# Altium footprint library Molex FFC - FPC Connectors (SMT).PcbLib: 638 footprints (part 15 of 40)
Each footprint in its own frame and in the unit in brackets; x right, y up, seen from the top. Pads: shape width x height; smd on the part's side, far side on the other; paste and mask are expansions set on the pad; w line width, h text height; cw(c..) or ccw(c..) is an arc to the next point about the centre after c.
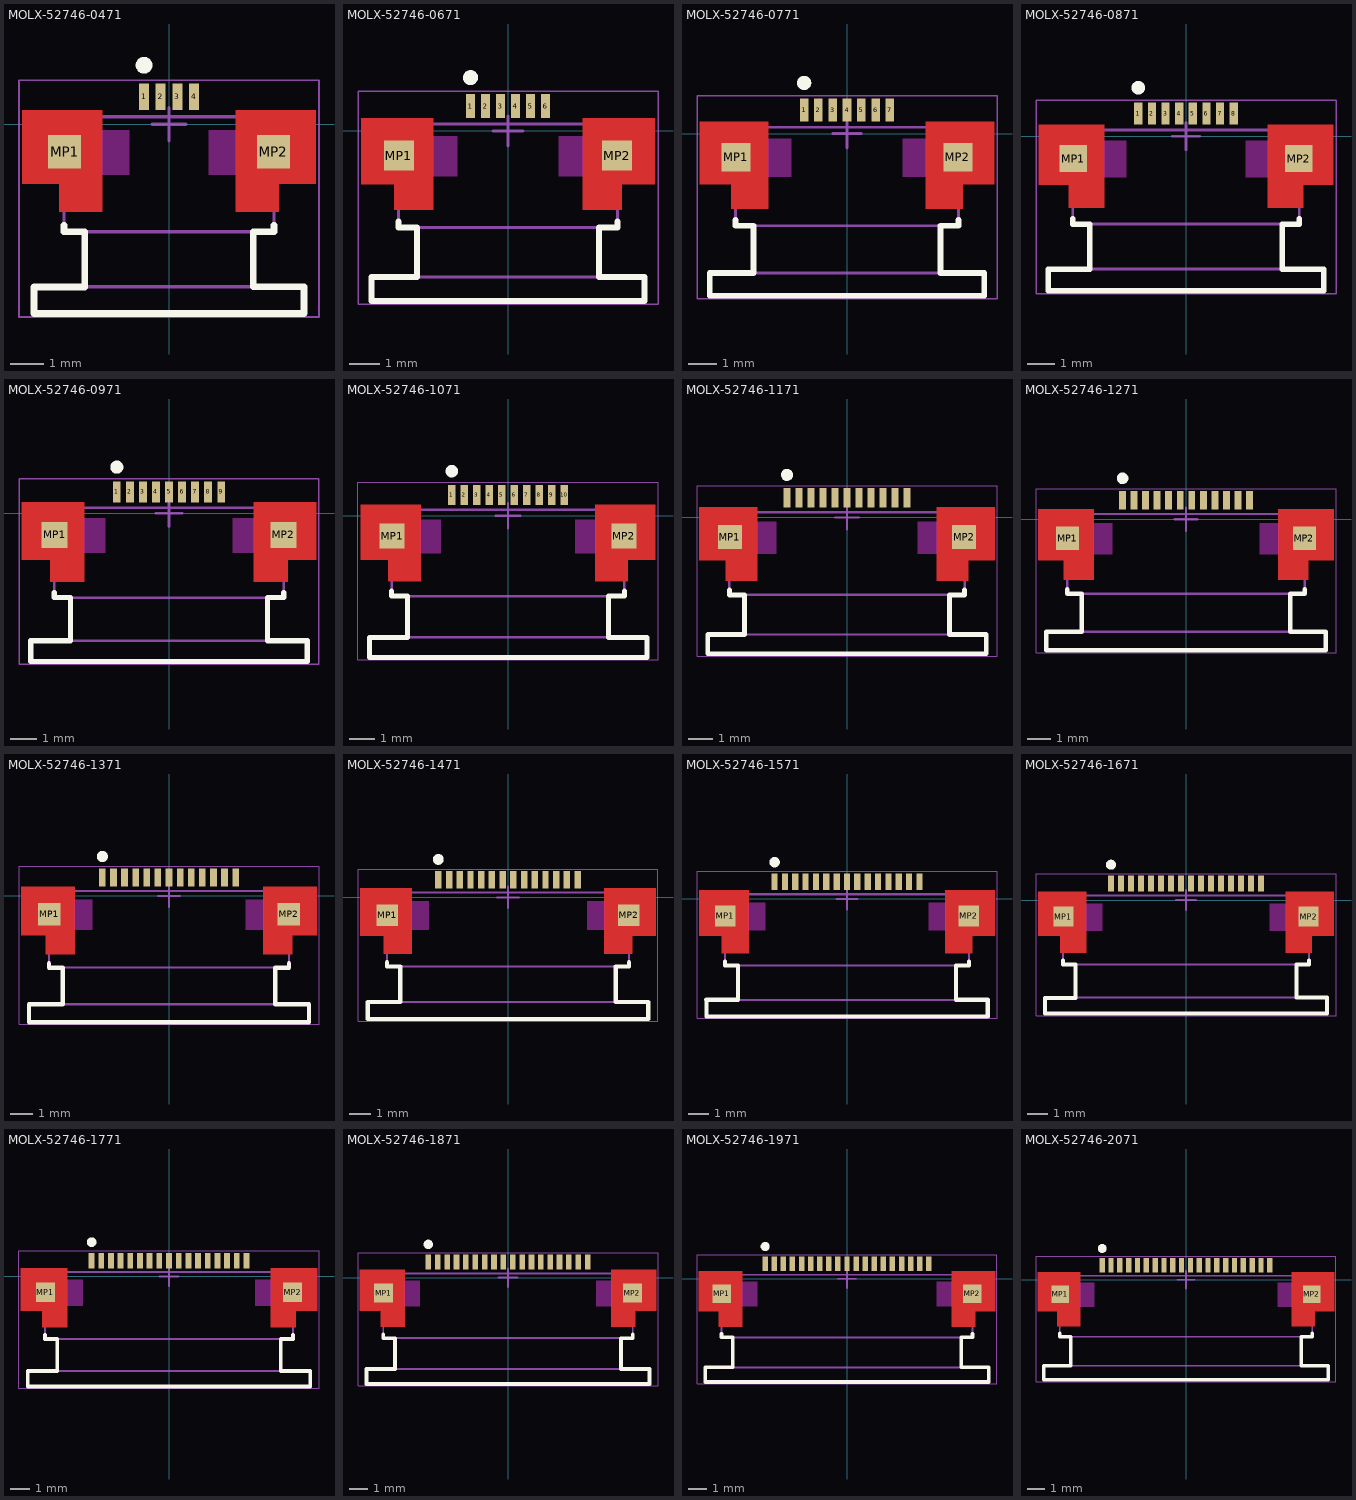
[diagram p14: the footprints below, top view; thin cyan lines are the x and y axes]

## MOLX-52746-0471 [mm] "FPC Connector, 4-Leads, Right Angle, Pitch 0.5 mm, Mated Height 2.0 mm, SMT"
height 2.012
pads (6):
  rect 0.3x0.8 smd: 1(-0.75,0.824) 2(-0.25,0.824) 3(0.25,0.824) 4(0.75,0.824)
  rect 1x1 smd: MP1(-3.134,-0.824) MP2(3.135,-0.824)
Top Layer:
  region: -4.4,0.424 -2,0.424 -2,-2.626 -3.3,-2.626 -3.3,-1.777 -3.3,-1.776 -4.4,-1.776
  region: 2,0.424 4.4,0.424 4.4,-1.776 4.4,-1.777 3.3,-1.777 3.3,-2.626 2,-2.626
Top Overlay:
  circle w0.25: c-0.75,1.774 r0.125
  lines w0.2: -4.05,-5.676 -4.05,-4.877 -2.525,-4.877 -2.525,-3.239 ; -4.049,-5.676 4.05,-5.676 4.05,-4.876 2.525,-4.876 2.525,-3.226 3.15,-3.226 3.15,-3.026 ; -3.15,-3.026 -3.15,-3.226 -2.525,-3.226
Keep-Out Layer:
  region: -2,-0.176 -1.2,-0.176 -1.2,-1.516 -2,-1.516
  region: 2,-0.176 1.2,-0.176 1.2,-1.516 2,-1.516
Mechanical 13:
  lines w0.1: -2.525,-4.876 -2.525,-3.226 ; 2.525,-4.876 2.525,-3.226 ; -4.05,-5.676 -4.05,-4.877 -2.4,-4.876 2.4,-4.876 4.05,-4.876 4.05,-5.677 -4.05,-5.677 ; -3.15,-3.226 -3.15,0.224 3.15,0.224 3.15,-3.226 2.4,-3.226 -2.4,-3.226 -3.15,-3.226
Mechanical 15:
  lines w0.05: -4.5,-5.777 -4.5,1.324 4.5,1.324 4.5,-5.777 -4.5,-5.777
  lines w0.1: -0.5,0 0.5,0 ; 0,-0.5 0,0.5
3D body: height 0.25, standoff 0, extent -4.05,-5.676 4.05,0.924

## MOLX-52746-0671 [mm] "FPC Connector, 6-Leads, Right Angle, Pitch 0.5 mm, Mated Height 2.0 mm, SMT"
height 2.012
pads (8):
  rect 0.3x0.8 smd: 1(-1.25,0.824) 2(-0.75,0.824) 3(-0.25,0.824) 4(0.25,0.824) 5(0.75,0.824) 6(1.25,0.824)
  rect 1x1 smd: MP1(-3.634,-0.824) MP2(3.635,-0.824)
Top Layer:
  region: -4.9,0.424 -2.5,0.424 -2.5,-2.626 -3.8,-2.626 -3.8,-1.777 -3.8,-1.776 -4.9,-1.776
  region: 2.5,0.424 4.9,0.424 4.9,-1.776 4.9,-1.777 3.8,-1.777 3.8,-2.626 2.5,-2.626
Top Overlay:
  circle w0.25: c-1.25,1.774 r0.125
  lines w0.2: -3.65,-3.026 -3.65,-3.226 -3.025,-3.226 ; -3.025,-3.239 -3.025,-4.876 -4.55,-4.877 -4.55,-5.676 4.55,-5.676 4.55,-4.876 3.025,-4.876 3.025,-3.226 3.65,-3.226 3.65,-3.026
Keep-Out Layer:
  region: -2.5,-0.176 -1.7,-0.176 -1.7,-1.516 -2.5,-1.516
  region: 2.5,-0.176 1.7,-0.176 1.7,-1.516 2.5,-1.516
Mechanical 13:
  lines w0.1: -4.55,-4.876 -2.9,-4.876 2.9,-4.876 4.55,-4.876 4.55,-5.677 -4.55,-5.677 -4.55,-4.877 ; -3.025,-4.876 -3.025,-3.226 ; 3.025,-4.876 3.025,-3.226 ; -3.65,-3.226 -3.65,0.224 3.65,0.224 3.65,-3.226 2.9,-3.226 -2.9,-3.226 -3.65,-3.226
Mechanical 15:
  lines w0.05: -5,-5.777 5,-5.777 5,1.324 -5,1.324 -5,-5.777
  lines w0.1: -0.5,0 0.5,0 ; 0,-0.5 0,0.5
3D body: height 0.25, standoff 0, extent -4.55,-5.676 4.55,0.924

## MOLX-52746-0771 [mm] "FPC Connector, 7-Leads, Right Angle, Pitch 0.5 mm, Mated Height 2.0 mm, SMT"
height 2.012
pads (9):
  rect 0.3x0.8 smd: 1(-1.5,0.824) 2(-1,0.824) 3(-0.5,0.824) 4(0,0.824) 5(0.5,0.824) 6(1,0.824) 7(1.5,0.824)
  rect 1x1 smd: MP1(-3.885,-0.824) MP2(3.885,-0.824)
Top Layer:
  region: 2.75,0.424 5.15,0.424 5.15,-1.776 5.15,-1.777 4.05,-1.777 4.05,-2.626 2.75,-2.626
  region: -5.15,0.424 -2.75,0.424 -2.75,-2.626 -4.05,-2.626 -4.05,-1.777 -4.05,-1.776 -5.15,-1.776
Top Overlay:
  circle w0.25: c-1.5,1.774 r0.125
  lines w0.2: -3.9,-3.026 -3.9,-3.226 -3.275,-3.226 ; -3.275,-3.239 -3.275,-4.876 -4.8,-4.877 -4.8,-5.676 4.8,-5.676 4.8,-4.876 3.275,-4.876 3.275,-3.226 3.9,-3.226 3.9,-3.026
Keep-Out Layer:
  region: 2.75,-0.176 1.95,-0.176 1.95,-1.516 2.75,-1.516
  region: -2.75,-0.176 -1.95,-0.176 -1.95,-1.516 -2.75,-1.516
Mechanical 13:
  lines w0.1: -4.8,-4.876 -3.15,-4.876 3.15,-4.876 4.8,-4.876 4.8,-5.677 -4.8,-5.677 -4.8,-4.877 ; -3.275,-4.876 -3.275,-3.226 ; 3.275,-4.876 3.275,-3.226 ; -3.9,-3.226 -3.15,-3.226 3.15,-3.226 3.9,-3.226 3.9,0.224 -3.9,0.224 -3.9,-3.226
Mechanical 15:
  lines w0.05: -5.25,-5.776 -5.25,1.324 5.25,1.324 5.25,-5.776 -5.25,-5.776
  lines w0.1: -0.5,0 0.5,0 ; 0,-0.5 0,0.5
3D body: height 0.25, standoff 0, extent -4.8,-5.676 4.8,0.924

## MOLX-52746-0871 [mm] "FPC Connector, 8-Leads, Right Angle, Pitch 0.5 mm, Mated Height 2.0 mm, SMT"
height 2.012
pads (10):
  rect 0.3x0.8 smd: 1(-1.75,0.824) 2(-1.25,0.824) 3(-0.75,0.824) 4(-0.25,0.824) 5(0.25,0.824) 6(0.75,0.824) 7(1.25,0.824) 8(1.75,0.824)
  rect 1x1 smd: MP1(-4.134,-0.824) MP2(4.135,-0.824)
Top Layer:
  region: -5.4,0.424 -3,0.424 -3,-2.626 -4.3,-2.626 -4.3,-1.777 -4.3,-1.776 -5.4,-1.776
  region: 3,0.424 5.4,0.424 5.4,-1.776 5.4,-1.777 4.3,-1.777 4.3,-2.626 3,-2.626
Top Overlay:
  circle w0.25: c-1.75,1.774 r0.125
  lines w0.2: -4.15,-3.026 -4.15,-3.226 -3.525,-3.226 ; -3.525,-3.239 -3.525,-4.876 -5.05,-4.877 -5.05,-5.676 5.05,-5.676 5.05,-4.876 3.525,-4.876 3.525,-3.226 4.15,-3.226 4.15,-3.026
Keep-Out Layer:
  region: -3,-0.176 -2.2,-0.176 -2.2,-1.516 -3,-1.516
  region: 3,-0.176 2.2,-0.176 2.2,-1.516 3,-1.516
Mechanical 13:
  lines w0.1: -3.525,-4.876 -3.525,-3.226 ; 3.525,-4.876 3.525,-3.226 ; -5.05,-5.676 -5.05,-4.877 -3.4,-4.876 3.4,-4.876 5.05,-4.876 5.05,-5.677 -5.05,-5.677 ; -4.15,-3.226 -4.15,0.224 4.15,0.224 4.15,-3.226 3.4,-3.226 -3.4,-3.226 -4.15,-3.226
Mechanical 15:
  lines w0.05: -5.5,-5.777 5.5,-5.777 5.5,1.324 -5.5,1.324 -5.5,-5.777
  lines w0.1: -0.5,0 0.5,0 ; 0,-0.5 0,0.5
3D body: height 0.25, standoff 0, extent -5.05,-5.676 5.05,0.924

## MOLX-52746-0971 [mm] "FPC Connector, 9-Leads, Right Angle, Pitch 0.5 mm, Mated Height 2.0 mm, SMT"
height 2.012
pads (11):
  rect 0.3x0.8 smd: 1(-2,0.824) 2(-1.5,0.824) 3(-1,0.824) 4(-0.5,0.824) 5(0,0.824) 6(0.5,0.824) 7(1,0.824) 8(1.5,0.824) 9(2,0.824)
  rect 1x1 smd: MP1(-4.384,-0.824) MP2(4.385,-0.824)
Top Layer:
  region: -5.65,0.424 -3.25,0.424 -3.25,-2.626 -4.55,-2.626 -4.55,-1.777 -4.55,-1.776 -5.65,-1.776
  region: 3.25,0.424 5.65,0.424 5.65,-1.776 5.65,-1.777 4.55,-1.777 4.55,-2.626 3.25,-2.626
Top Overlay:
  circle w0.25: c-2,1.774 r0.125
  lines w0.2: -4.4,-3.026 -4.4,-3.226 -3.775,-3.226 ; -3.775,-3.239 -3.775,-4.876 -5.3,-4.877 -5.3,-5.676 5.3,-5.676 5.3,-4.876 3.775,-4.876 3.775,-3.226 4.4,-3.226 4.4,-3.026
Keep-Out Layer:
  region: -3.25,-0.176 -2.45,-0.176 -2.45,-1.516 -3.25,-1.516
  region: 3.25,-0.176 2.45,-0.176 2.45,-1.516 3.25,-1.516
Mechanical 13:
  lines w0.1: -3.775,-4.876 -3.775,-3.226 ; 3.775,-4.876 3.775,-3.226 ; -5.3,-5.676 -5.3,-4.877 -3.65,-4.876 3.65,-4.876 5.3,-4.876 5.3,-5.677 -5.3,-5.677 ; -4.4,-3.226 -4.4,0.224 4.4,0.224 4.4,-3.226 3.65,-3.226 -3.65,-3.226 -4.4,-3.226
Mechanical 15:
  lines w0.05: -5.75,-5.776 5.75,-5.776 5.75,1.324 -5.75,1.324 -5.75,-5.776
  lines w0.1: -0.5,0 0.5,0 ; 0,-0.5 0,0.5
3D body: height 0.25, standoff 0, extent -5.3,-5.676 5.3,0.924

## MOLX-52746-1071 [mm] "FPC Connector, 10-Leads, Right Angle, Pitch 0.5 mm, Mated Height 2.0 mm, SMT"
height 2.012
pads (12):
  rect 0.3x0.8 smd: 1(-2.25,0.824) 2(-1.75,0.824) 3(-1.25,0.824) 4(-0.75,0.824) 5(-0.25,0.824) 6(0.25,0.824) 7(0.75,0.824) 8(1.25,0.824) 9(1.75,0.824) 10(2.25,0.824)
  rect 1x1 smd: MP1(-4.634,-0.824) MP2(4.635,-0.824)
Top Layer:
  region: -5.9,0.424 -3.5,0.424 -3.5,-2.626 -4.8,-2.626 -4.8,-1.777 -4.8,-1.776 -5.9,-1.776
  region: 3.5,0.424 5.9,0.424 5.9,-1.776 5.9,-1.777 4.8,-1.777 4.8,-2.626 3.5,-2.626
Top Overlay:
  circle w0.25: c-2.25,1.774 r0.125
  lines w0.2: -4.65,-3.026 -4.65,-3.226 -4.025,-3.226 ; -4.025,-3.239 -4.025,-4.876 -5.55,-4.877 -5.55,-5.676 5.55,-5.676 5.55,-4.876 4.025,-4.876 4.025,-3.226 4.65,-3.226 4.65,-3.026
Keep-Out Layer:
  region: -3.5,-0.176 -2.7,-0.176 -2.7,-1.516 -3.5,-1.516
  region: 3.5,-0.176 2.7,-0.176 2.7,-1.516 3.5,-1.516
Mechanical 13:
  lines w0.1: -4.025,-4.876 -4.025,-3.226 ; 4.025,-4.876 4.025,-3.226 ; -5.55,-5.676 -5.55,-4.877 -3.9,-4.876 3.9,-4.876 5.55,-4.876 5.55,-5.677 -5.55,-5.677 ; -4.65,-3.226 -4.65,0.224 4.65,0.224 4.65,-3.226 3.9,-3.226 -3.9,-3.226 -4.65,-3.226
Mechanical 15:
  lines w0.05: -6,-5.777 6,-5.777 6,1.324 -6,1.324 -6,-5.777
  lines w0.1: -0.5,0 0.5,0 ; 0,-0.5 0,0.5
3D body: height 0.25, standoff 0, extent -5.55,-5.676 5.55,0.924

## MOLX-52746-1171 [mm] "FPC Connector, 11-Leads, Right Angle, Pitch 0.5 mm, Mated Height 2.0 mm, SMT"
height 2.012
pads (13):
  rect 0.3x0.8 smd: 1(-2.5,0.824) 2(-2,0.824) 3(-1.5,0.824) 4(-1,0.824) 5(-0.5,0.824) 6(0,0.824) 7(0.5,0.824) 8(1,0.824) 9(1.5,0.824) 10(2,0.824) 11(2.5,0.824)
  rect 1x1 smd: MP1(-4.884,-0.824) MP2(4.884,-0.824)
Top Layer:
  region: -6.15,0.424 -3.75,0.424 -3.75,-2.626 -5.05,-2.626 -5.05,-1.777 -5.05,-1.776 -6.15,-1.776
  region: 3.75,0.424 6.15,0.424 6.15,-1.776 6.15,-1.777 5.05,-1.777 5.05,-2.626 3.75,-2.626
Top Overlay:
  circle w0.25: c-2.5,1.774 r0.125
  lines w0.2: -4.9,-3.026 -4.9,-3.226 -4.275,-3.226 ; -4.275,-3.239 -4.275,-4.876 -5.8,-4.877 -5.8,-5.676 5.8,-5.676 5.8,-4.876 4.275,-4.876 4.275,-3.226 4.9,-3.226 4.9,-3.026
Keep-Out Layer:
  region: -3.75,-0.176 -2.95,-0.176 -2.95,-1.516 -3.75,-1.516
  region: 3.75,-0.176 2.95,-0.176 2.95,-1.516 3.75,-1.516
Mechanical 13:
  lines w0.1: -4.275,-4.876 -4.275,-3.226 ; 4.275,-4.876 4.275,-3.226 ; -5.8,-5.676 -5.8,-4.877 -4.15,-4.876 4.15,-4.876 5.8,-4.876 5.8,-5.677 -5.8,-5.677 ; -4.9,-3.226 -4.9,0.224 4.9,0.224 4.9,-3.226 4.15,-3.226 -4.15,-3.226 -4.9,-3.226
Mechanical 15:
  lines w0.05: -6.25,-5.776 6.25,-5.776 6.25,1.324 -6.25,1.324 -6.25,-5.776
  lines w0.1: -0.5,0 0.5,0 ; 0,-0.5 0,0.5
3D body: height 0.25, standoff 0, extent -5.8,-5.676 5.8,0.924

## MOLX-52746-1271 [mm] "FPC Connector, 12-Leads, Right Angle, Pitch 0.5 mm, Mated Height 2.0 mm, SMT"
height 2.012
pads (14):
  rect 0.3x0.8 smd: 1(-2.75,0.824) 2(-2.25,0.824) 3(-1.75,0.824) 4(-1.25,0.824) 5(-0.75,0.824) 6(-0.25,0.824) 7(0.25,0.824) 8(0.75,0.824) 9(1.25,0.824) 10(1.75,0.824) 11(2.25,0.824) 12(2.75,0.824)
  rect 1x1 smd: MP1(-5.134,-0.824) MP2(5.135,-0.824)
Top Layer:
  region: 4,0.424 6.4,0.424 6.4,-1.776 6.4,-1.777 5.3,-1.777 5.3,-2.626 4,-2.626
  region: -6.4,0.424 -4,0.424 -4,-2.626 -5.3,-2.626 -5.3,-1.777 -5.3,-1.776 -6.4,-1.776
Top Overlay:
  circle w0.25: c-2.75,1.774 r0.125
  lines w0.2: -6.05,-4.877 -4.525,-4.877 -4.525,-3.239 ; -6.05,-4.877 -6.05,-5.676 6.05,-5.676 6.05,-4.876 4.525,-4.876 4.525,-3.226 5.15,-3.226 5.15,-3.026 ; -5.15,-3.026 -5.15,-3.226 -4.525,-3.226
Keep-Out Layer:
  region: 4,-0.176 3.2,-0.176 3.2,-1.516 4,-1.516
  region: -4,-0.176 -3.2,-0.176 -3.2,-1.516 -4,-1.516
Mechanical 13:
  lines w0.1: -4.525,-4.876 -4.525,-3.226 ; 4.525,-4.876 4.525,-3.226 ; -6.05,-5.677 6.05,-5.677 6.05,-4.876 4.4,-4.876 -4.4,-4.876 -6.05,-4.876 -6.05,-5.676 ; -5.15,-3.226 -4.4,-3.226 4.4,-3.226 5.15,-3.226 5.15,0.224 -5.15,0.224 -5.15,-3.226
Mechanical 15:
  lines w0.05: -6.5,-5.777 -6.5,1.324 6.5,1.324 6.5,-5.777 -6.5,-5.777
  lines w0.1: -0.5,0 0.5,0 ; 0,-0.5 0,0.5
3D body: height 0.25, standoff 0, extent -6.05,-5.676 6.05,0.924

## MOLX-52746-1371 [mm] "FPC Connector, 13-Leads, Right Angle, Pitch 0.5 mm, Mated Height 2.0 mm, SMT"
height 2.012
pads (15):
  rect 0.3x0.8 smd: 1(-3,0.824) 2(-2.5,0.824) 3(-2,0.824) 4(-1.5,0.824) 5(-1,0.824) 6(-0.5,0.824) 7(0,0.824) 8(0.5,0.824) 9(1,0.824) 10(1.5,0.824) 11(2,0.824) 12(2.5,0.824) 13(3,0.824)
  rect 1x1 smd: MP1(-5.384,-0.824) MP2(5.385,-0.824)
Top Layer:
  region: 4.25,0.424 6.65,0.424 6.65,-1.776 6.65,-1.777 5.55,-1.777 5.55,-2.626 4.25,-2.626
  region: -6.65,0.424 -4.25,0.424 -4.25,-2.626 -5.55,-2.626 -5.55,-1.777 -5.55,-1.776 -6.65,-1.776
Top Overlay:
  circle w0.25: c-3,1.774 r0.125
  lines w0.2: -5.4,-3.026 -5.4,-3.226 -4.775,-3.226 ; -4.775,-3.239 -4.775,-4.876 -6.3,-4.877 -6.3,-5.676 6.3,-5.676 6.3,-4.876 4.775,-4.876 4.775,-3.226 5.4,-3.226 5.4,-3.026
Keep-Out Layer:
  region: 4.25,-0.176 3.45,-0.176 3.45,-1.516 4.25,-1.516
  region: -4.25,-0.176 -3.45,-0.176 -3.45,-1.516 -4.25,-1.516
Mechanical 13:
  lines w0.1: -6.3,-4.876 -4.65,-4.876 4.65,-4.876 6.3,-4.876 6.3,-5.677 -6.3,-5.677 -6.3,-4.877 ; -4.775,-4.876 -4.775,-3.226 ; 4.775,-4.876 4.775,-3.226 ; -5.4,-3.226 -4.65,-3.226 4.65,-3.226 5.4,-3.226 5.4,0.224 -5.4,0.224 -5.4,-3.226
Mechanical 15:
  lines w0.05: -6.75,-5.776 -6.75,1.324 6.75,1.324 6.75,-5.776 -6.75,-5.776
  lines w0.1: -0.5,0 0.5,0 ; 0,-0.5 0,0.5
3D body: height 0.25, standoff 0, extent -6.3,-5.676 6.3,0.924

## MOLX-52746-1471 [mm] "FPC Connector, 14-Leads, Right Angle, Pitch 0.5 mm, Mated Height 2.0 mm, SMT"
height 2.012
pads (16):
  rect 0.3x0.8 smd: 1(-3.25,0.824) 2(-2.75,0.824) 3(-2.25,0.824) 4(-1.75,0.824) 5(-1.25,0.824) 6(-0.75,0.824) 7(-0.25,0.824) 8(0.25,0.824) 9(0.75,0.824) 10(1.25,0.824) 11(1.75,0.824) 12(2.25,0.824) 13(2.75,0.824) 14(3.25,0.824)
  rect 1x1 smd: MP1(-5.634,-0.824) MP2(5.634,-0.824)
Top Layer:
  region: 4.5,0.424 6.9,0.424 6.9,-1.776 6.9,-1.777 5.8,-1.777 5.8,-2.626 4.5,-2.626
  region: -6.9,0.424 -4.5,0.424 -4.5,-2.626 -5.8,-2.626 -5.8,-1.777 -5.8,-1.776 -6.9,-1.776
Top Overlay:
  circle w0.25: c-3.25,1.774 r0.125
  lines w0.2: -5.65,-3.026 -5.65,-3.226 -5.025,-3.226 ; -5.025,-3.239 -5.025,-4.876 -6.55,-4.877 -6.55,-5.676 6.55,-5.676 6.55,-4.876 5.025,-4.876 5.025,-3.226 5.65,-3.226 5.65,-3.026
Keep-Out Layer:
  region: 4.5,-0.176 3.7,-0.176 3.7,-1.516 4.5,-1.516
  region: -4.5,-0.176 -3.7,-0.176 -3.7,-1.516 -4.5,-1.516
Mechanical 13:
  lines w0.1: -5.025,-4.876 -5.025,-3.226 ; 5.025,-4.876 5.025,-3.226 ; -6.55,-5.677 6.55,-5.677 6.55,-4.876 4.9,-4.876 -4.9,-4.876 -6.55,-4.876 -6.55,-5.676 ; -5.65,-3.226 -4.9,-3.226 4.9,-3.226 5.65,-3.226 5.65,0.224 -5.65,0.224 -5.65,-3.226
Mechanical 15:
  lines w0.05: -7,-5.777 -7,1.324 7,1.324 7,-5.777 -7,-5.777
  lines w0.1: -0.5,0 0.5,0 ; 0,-0.5 0,0.5
3D body: height 0.25, standoff 0, extent -6.55,-5.676 6.55,0.924

## MOLX-52746-1571 [mm] "FPC Connector, 15-Leads, Right Angle, Pitch 0.5 mm, Mated Height 2.0 mm, SMT"
height 2.012
pads (17):
  rect 0.3x0.8 smd: 1(-3.5,0.824) 2(-3,0.824) 3(-2.5,0.824) 4(-2,0.824) 5(-1.5,0.824) 6(-1,0.824) 7(-0.5,0.824) 8(0,0.824) 9(0.5,0.824) 10(1,0.824) 11(1.5,0.824) 12(2,0.824) 13(2.5,0.824) 14(3,0.824) 15(3.5,0.824)
  rect 1x1 smd: MP1(-5.884,-0.824) MP2(5.884,-0.824)
Top Layer:
  region: 4.75,0.424 7.15,0.424 7.15,-1.776 7.15,-1.777 6.05,-1.777 6.05,-2.626 4.75,-2.626
  region: -7.15,0.424 -4.75,0.424 -4.75,-2.626 -6.05,-2.626 -6.05,-1.777 -6.05,-1.776 -7.15,-1.776
Top Overlay:
  circle w0.25: c-3.5,1.774 r0.125
  lines w0.2: -5.9,-3.026 -5.9,-3.226 -5.275,-3.226 ; -5.275,-3.239 -5.275,-4.876 -6.8,-4.877 -6.8,-5.676 6.8,-5.676 6.8,-4.876 5.275,-4.876 5.275,-3.226 5.9,-3.226 5.9,-3.026
Keep-Out Layer:
  region: 4.75,-0.176 3.95,-0.176 3.95,-1.516 4.75,-1.516
  region: -4.75,-0.176 -3.95,-0.176 -3.95,-1.516 -4.75,-1.516
Mechanical 13:
  lines w0.1: -5.275,-4.876 -5.275,-3.226 ; 5.275,-4.876 5.275,-3.226 ; -6.8,-5.677 6.8,-5.677 6.8,-4.876 5.15,-4.876 -5.15,-4.876 -6.8,-4.876 -6.8,-5.676 ; -5.9,-3.226 -5.15,-3.226 5.15,-3.226 5.9,-3.226 5.9,0.224 -5.9,0.224 -5.9,-3.226
Mechanical 15:
  lines w0.05: -7.25,-5.776 -7.25,1.324 7.25,1.324 7.25,-5.776 -7.25,-5.776
  lines w0.1: -0.5,0 0.5,0 ; 0,-0.5 0,0.5
3D body: height 0.25, standoff 0, extent -6.8,-5.676 6.8,0.924

## MOLX-52746-1671 [mm] "FPC Connector, 16-Leads, Right Angle, Pitch 0.5 mm, Mated Height 2.0 mm, SMT"
height 2.012
pads (18):
  rect 0.3x0.8 smd: 1(-3.75,0.824) 2(-3.25,0.824) 3(-2.75,0.824) 4(-2.25,0.824) 5(-1.75,0.824) 6(-1.25,0.824) 7(-0.75,0.824) 8(-0.25,0.824) 9(0.25,0.824) 10(0.75,0.824) 11(1.25,0.824) 12(1.75,0.824) 13(2.25,0.824) 14(2.75,0.824) 15(3.25,0.824) 16(3.75,0.824)
  rect 1x1 smd: MP1(-6.134,-0.824) MP2(6.134,-0.824)
Top Layer:
  region: -7.4,0.424 -5,0.424 -5,-2.626 -6.3,-2.626 -6.3,-1.777 -6.3,-1.776 -7.4,-1.776
  region: 5,0.424 7.4,0.424 7.4,-1.776 7.4,-1.777 6.3,-1.777 6.3,-2.626 5,-2.626
Top Overlay:
  circle w0.25: c-3.75,1.774 r0.125
  lines w0.2: -6.15,-3.026 -6.15,-3.226 -5.525,-3.226 ; -5.525,-3.239 -5.525,-4.876 -7.05,-4.877 -7.05,-5.676 7.05,-5.676 7.05,-4.876 5.525,-4.876 5.525,-3.226 6.15,-3.226 6.15,-3.026
Keep-Out Layer:
  region: -5,-0.176 -4.2,-0.176 -4.2,-1.516 -5,-1.516
  region: 5,-0.176 4.2,-0.176 4.2,-1.516 5,-1.516
Mechanical 13:
  lines w0.1: -5.525,-4.876 -5.525,-3.226 ; 5.525,-4.876 5.525,-3.226 ; -7.05,-5.676 -7.05,-4.877 -5.4,-4.876 5.4,-4.876 7.05,-4.876 7.05,-5.677 -7.05,-5.677 ; -6.15,-3.226 -6.15,0.224 6.15,0.224 6.15,-3.226 5.4,-3.226 -5.4,-3.226 -6.15,-3.226
Mechanical 15:
  lines w0.05: -7.5,-5.777 7.5,-5.777 7.5,1.324 -7.5,1.324 -7.5,-5.777
  lines w0.1: -0.5,0 0.5,0 ; 0,-0.5 0,0.5
3D body: height 0.25, standoff 0, extent -7.05,-5.676 7.05,0.924

## MOLX-52746-1771 [mm] "FPC Connector, 17-Leads, Right Angle, Pitch 0.5 mm, Mated Height 2.0 mm, SMT"
height 2.012
pads (19):
  rect 0.3x0.8 smd: 1(-4,0.824) 2(-3.5,0.824) 3(-3,0.824) 4(-2.5,0.824) 5(-2,0.824) 6(-1.5,0.824) 7(-1,0.824) 8(-0.5,0.824) 9(0,0.824) 10(0.5,0.824) 11(1,0.824) 12(1.5,0.824) 13(2,0.824) 14(2.5,0.824) 15(3,0.824) 16(3.5,0.824) 17(4,0.824)
  rect 1x1 smd: MP1(-6.384,-0.824) MP2(6.384,-0.824)
Top Layer:
  region: -7.65,0.424 -5.25,0.424 -5.25,-2.626 -6.55,-2.626 -6.55,-1.777 -6.55,-1.776 -7.65,-1.776
  region: 5.25,0.424 7.65,0.424 7.65,-1.776 7.65,-1.777 6.55,-1.777 6.55,-2.626 5.25,-2.626
Top Overlay:
  circle w0.25: c-4,1.774 r0.125
  lines w0.2: -6.4,-3.026 -6.4,-3.226 -5.775,-3.226 ; -5.775,-3.239 -5.775,-4.876 -7.3,-4.877 -7.3,-5.676 7.3,-5.676 7.3,-4.876 5.775,-4.876 5.775,-3.226 6.4,-3.226 6.4,-3.026
Keep-Out Layer:
  region: -5.25,-0.176 -4.45,-0.176 -4.45,-1.516 -5.25,-1.516
  region: 5.25,-0.176 4.45,-0.176 4.45,-1.516 5.25,-1.516
Mechanical 13:
  lines w0.1: -5.775,-4.876 -5.775,-3.226 ; 5.775,-4.876 5.775,-3.226 ; -7.3,-5.676 -7.3,-4.877 -5.65,-4.876 5.65,-4.876 7.3,-4.876 7.3,-5.677 -7.3,-5.677 ; -6.4,-3.226 -6.4,0.224 6.4,0.224 6.4,-3.226 5.65,-3.226 -5.65,-3.226 -6.4,-3.226
Mechanical 15:
  lines w0.05: -7.75,-5.776 7.75,-5.776 7.75,1.324 -7.75,1.324 -7.75,-5.776
  lines w0.1: -0.5,0 0.5,0 ; 0,-0.5 0,0.5
3D body: height 0.25, standoff 0, extent -7.3,-5.676 7.3,0.924

## MOLX-52746-1871 [mm] "FPC Connector, 18-Leads, Right Angle, Pitch 0.5 mm, Mated Height 2.0 mm, SMT"
height 2.012
pads (20):
  rect 0.3x0.8 smd: 1(-4.25,0.824) 2(-3.75,0.824) 3(-3.25,0.824) 4(-2.75,0.824) 5(-2.25,0.824) 6(-1.75,0.824) 7(-1.25,0.824) 8(-0.75,0.824) 9(-0.25,0.824) 10(0.25,0.824) 11(0.75,0.824) 12(1.25,0.824) 13(1.75,0.824) 14(2.25,0.824) 15(2.75,0.824) 16(3.25,0.824) 17(3.75,0.824) 18(4.25,0.824)
  rect 1x1 smd: MP1(-6.634,-0.824) MP2(6.634,-0.824)
Top Layer:
  region: -7.9,0.424 -5.5,0.424 -5.5,-2.626 -6.8,-2.626 -6.8,-1.777 -6.8,-1.776 -7.9,-1.776
  region: 5.5,0.424 7.9,0.424 7.9,-1.776 7.9,-1.777 6.8,-1.777 6.8,-2.626 5.5,-2.626
Top Overlay:
  circle w0.25: c-4.25,1.774 r0.125
  lines w0.2: -6.65,-3.026 -6.65,-3.226 -6.025,-3.226 ; -6.025,-3.239 -6.025,-4.876 -7.55,-4.877 -7.55,-5.676 7.55,-5.676 7.55,-4.876 6.025,-4.876 6.025,-3.226 6.65,-3.226 6.65,-3.026
Keep-Out Layer:
  region: -5.5,-0.176 -4.7,-0.176 -4.7,-1.516 -5.5,-1.516
  region: 5.5,-0.176 4.7,-0.176 4.7,-1.516 5.5,-1.516
Mechanical 13:
  lines w0.1: -6.025,-4.867 -6.025,-3.226 ; 6.025,-4.876 6.025,-3.226 ; -7.55,-5.676 -7.55,-4.877 -5.9,-4.876 5.9,-4.876 7.55,-4.876 7.55,-5.677 -7.55,-5.677 ; -6.65,-3.226 -6.65,0.224 6.65,0.224 6.65,-3.226 5.9,-3.226 -5.9,-3.226 -6.65,-3.226
Mechanical 15:
  lines w0.05: -8,-5.777 8,-5.777 8,1.324 -8,1.324 -8,-5.777
  lines w0.1: -0.5,0 0.5,0 ; 0,-0.5 0,0.5
3D body: height 0.25, standoff 0, extent -7.55,-5.676 7.55,0.924

## MOLX-52746-1971 [mm] "FPC Connector, 19-Leads, Right Angle, Pitch 0.5 mm, Mated Height 2.0 mm, SMT"
height 2.012
pads (21):
  rect 0.3x0.8 smd: 1(-4.5,0.824) 2(-4,0.824) 3(-3.5,0.824) 4(-3,0.824) 5(-2.5,0.824) 6(-2,0.824) 7(-1.5,0.824) 8(-1,0.824) 9(-0.5,0.824) 10(0,0.824) 11(0.5,0.824) 12(1,0.824) 13(1.5,0.824) 14(2,0.824) 15(2.5,0.824) 16(3,0.824) 17(3.5,0.824) 18(4,0.824) 19(4.5,0.824)
  rect 1x1 smd: MP1(-6.884,-0.824) MP2(6.884,-0.824)
Top Layer:
  region: 5.75,0.424 8.15,0.424 8.15,-1.776 8.15,-1.777 7.05,-1.777 7.05,-2.626 5.75,-2.626
  region: -8.15,0.424 -5.75,0.424 -5.75,-2.626 -7.05,-2.626 -7.05,-1.777 -7.05,-1.776 -8.15,-1.776
Top Overlay:
  circle w0.25: c-4.5,1.774 r0.125
  lines w0.2: -7.8,-4.877 -6.275,-4.877 -6.275,-3.239 ; -7.8,-4.877 -7.8,-5.676 7.8,-5.676 7.8,-4.876 6.275,-4.876 6.275,-3.226 6.9,-3.226 6.9,-3.026 ; -6.9,-3.026 -6.9,-3.226 -6.275,-3.226
Keep-Out Layer:
  region: 5.75,-0.176 4.95,-0.176 4.95,-1.516 5.75,-1.516
  region: -5.75,-0.176 -4.95,-0.176 -4.95,-1.516 -5.75,-1.516
Mechanical 13:
  lines w0.1: -6.275,-4.876 -6.275,-3.226 ; 6.275,-4.876 6.275,-3.226 ; -7.8,-5.677 7.8,-5.677 7.8,-4.876 6.15,-4.876 -6.15,-4.876 -7.8,-4.876 -7.8,-5.676 ; -6.9,-3.226 -6.15,-3.226 6.15,-3.226 6.9,-3.226 6.9,0.224 -6.9,0.224 -6.9,-3.226
Mechanical 15:
  lines w0.05: -8.25,-5.776 -8.25,1.324 8.25,1.324 8.25,-5.776 -8.25,-5.776
  lines w0.1: -0.5,0 0.5,0 ; 0,-0.5 0,0.5
3D body: height 0.25, standoff 0, extent -7.8,-5.677 7.8,0.924

## MOLX-52746-2071 [mm] "FPC Connector, 20-Leads, Right Angle, Pitch 0.5 mm, Mated Height 2.0 mm, SMT"
height 2.012
pads (22):
  rect 0.3x0.8 smd: 1(-4.75,0.824) 2(-4.25,0.824) 3(-3.75,0.824) 4(-3.25,0.824) 5(-2.75,0.824) 6(-2.25,0.824) 7(-1.75,0.824) 8(-1.25,0.824) 9(-0.75,0.824) 10(-0.25,0.824) 11(0.25,0.824) 12(0.75,0.824) 13(1.25,0.824) 14(1.75,0.824) 15(2.25,0.824) 16(2.75,0.824) 17(3.25,0.824) 18(3.75,0.824) 19(4.25,0.824) 20(4.75,0.824)
  rect 1x1 smd: MP1(-7.134,-0.824) MP2(7.134,-0.824)
Top Layer:
  region: -8.4,0.424 -6,0.424 -6,-2.626 -7.3,-2.626 -7.3,-1.777 -7.3,-1.776 -8.4,-1.776
  region: 6,0.424 8.4,0.424 8.4,-1.776 8.4,-1.777 7.3,-1.777 7.3,-2.626 6,-2.626
Top Overlay:
  circle w0.25: c-4.75,1.774 r0.125
  lines w0.2: -7.15,-3.026 -7.15,-3.226 -6.525,-3.226 ; -6.525,-3.239 -6.525,-4.876 -8.05,-4.877 -8.05,-5.676 8.05,-5.676 8.05,-4.876 6.525,-4.876 6.525,-3.226 7.15,-3.226 7.15,-3.026
Keep-Out Layer:
  region: -6,-0.176 -5.2,-0.176 -5.2,-1.516 -6,-1.516
  region: 6,-0.176 5.2,-0.176 5.2,-1.516 6,-1.516
Mechanical 13:
  lines w0.1: -8.05,-4.876 -6.4,-4.876 6.4,-4.876 8.05,-4.876 8.05,-5.677 -8.05,-5.677 -8.05,-4.877 ; -6.525,-4.876 -6.525,-3.226 ; 6.525,-4.876 6.525,-3.226 ; -7.15,-3.226 -7.15,0.224 7.15,0.224 7.15,-3.226 6.4,-3.226 -6.4,-3.226 -7.15,-3.226
Mechanical 15:
  lines w0.05: -8.5,-5.777 8.5,-5.777 8.5,1.324 -8.5,1.324 -8.5,-5.777
  lines w0.1: -0.5,0 0.5,0 ; 0,-0.5 0,0.5
3D body: height 0.25, standoff 0, extent -8.05,-5.676 8.05,0.924